# Altium integrated library STM32F466_EVAL_BOARD.IntLib: 93 symbols
Pins are listed as number, name and electrical type; pins without a type are passive.

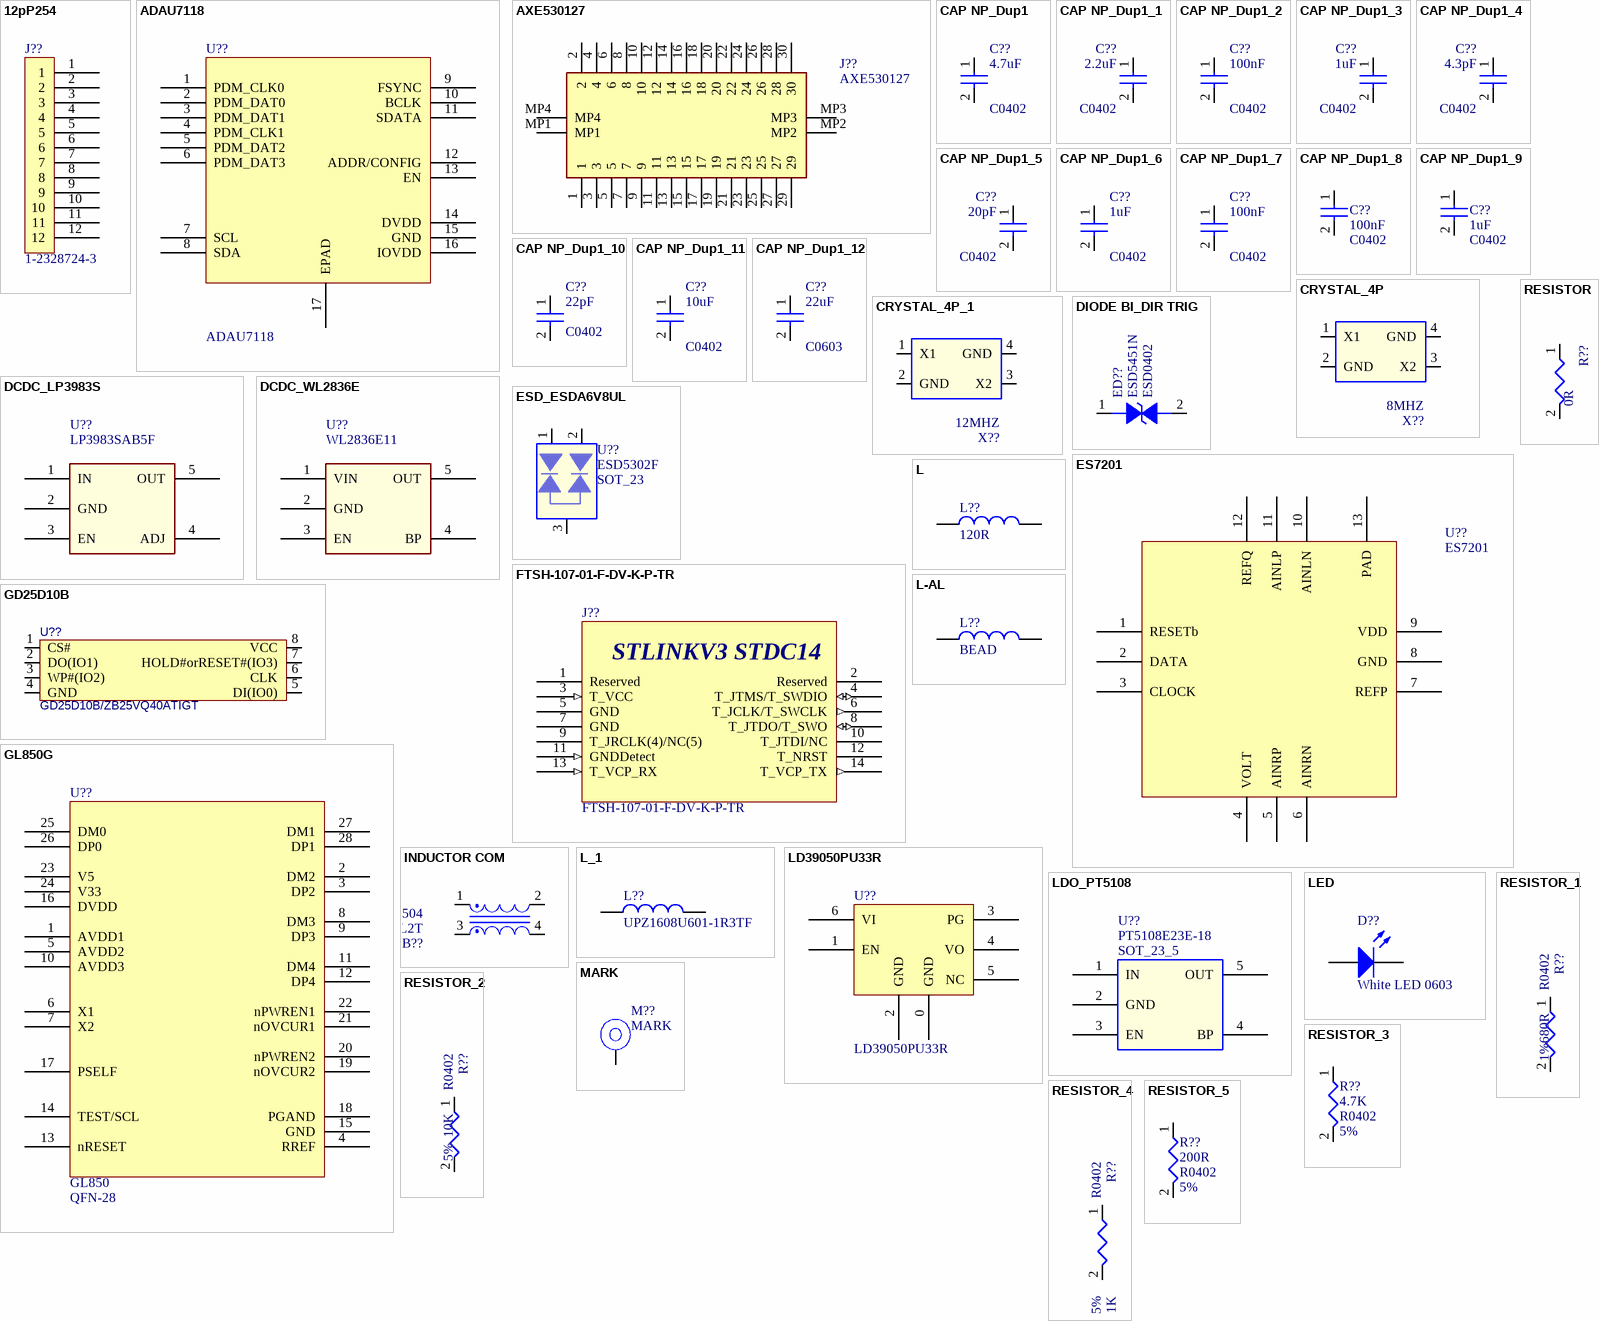
[diagram p0: symbols 12pP254 to RESISTOR_5]

## 12pP254
designator J??, comment 1-2328724-3
FFC & FPC连接器 13 PIN FPC CONNECTOR 0.3mmP FRONT FLIP
footprint 123287243
pins: 1, 2, 3, 4, 5, 6, 7, 8, 9, 10, 11, 12

## ADAU7118
designator U??
16-lead, 3 mm × 3 mm, 0.50 mm pitch LFCSP
footprint QFN50P300X300X80-17N
pins: 1 PDM_CLK0, 2 PDM_DAT0, 3 PDM_DAT1, 4 PDM_CLK1, 5 PDM_DAT2, 6 PDM_DAT3, 7 SCL, 8 SDA, 9 FSYNC, 10 BCLK, 11 SDATA, 12 ADDR/CONFIG, 13 EN, 14 DVDD, 15 GND, 16 IOVDD, 17 EPAD

## AXE530127
designator J??
AXE530127 Connector; Manufacturer_Name: Panasonic; Datasheet Link: https://componentsearchengine.com//AXE530127.pdf; Height: 0.97mm; Mouser2 Part Number: 679-AXE530127; Mouser2 Price/Stock: https://www.mouser.com/Search/Refine.aspx?Keyword=679-AXE530127; Manufacturer_Part_Number: AXE530127
footprint AXE530127_counterclock_pin
pins: 1, 2, 3, 4, 5, 6, 7, 8, 9, 10, 11, 12, 13, 14, 15, 16, 17, 18, 19, 20, 21, 22, 23, 24, 25, 26, 27, 28, 29, 30, MP1, MP2, MP3, MP4

## CAP NP_Dup1
designator C??, comment 4.7uF  PCB Footprint: C0402
cap,4.70uF,+/-10%,6.3V,X5R,C0402; Priority: A; Part Type: C0402
footprint C0402_L (无极性贴片电容)
pins: 1, 2

## CAP NP_Dup1_1
designator C??, comment 2.2uF  PCB Footprint: C0402
cap,2.20uF,+/-10%,10V,X5R,C0402; Priority: A; Part Type: C0402
footprint C0402_L (无极性贴片电容)
pins: 1, 2

## CAP NP_Dup1_2
designator C??, comment 100nF  PCB Footprint: C0402
cap,100.00nF,+/-10%,10V,X5R,C0402; Priority: A; Part Type: C0402
footprint C0402_L (无极性贴片电容)
pins: 1, 2

## CAP NP_Dup1_3
designator C??, comment 1uF  PCB Footprint: C0402
cap,1.00uF,+/-10%,10V,X5R,C0402; Priority: A; Part Type: C0402
footprint C0402_L (无极性贴片电容)
pins: 1, 2

## CAP NP_Dup1_4
designator C??, comment 4.3pF  PCB Footprint: C0402
cap,4.3pF,+/-10%,25V,X5R,C0402; Priority: A; Part Type: C0402
footprint C0402_L (无极性贴片电容)
pins: 1, 2

## CAP NP_Dup1_5
designator C??, comment 20pF  PCB Footprint: C0402
cap,20pF,+/-10%,25V,X5R,C0402; Priority: A; Part Type: C0402
footprint C0402_L (无极性贴片电容)
pins: 1, 2

## CAP NP_Dup1_6
designator C??, comment 1uF  PCB Footprint: C0402
cap,1.00uF,+/-10%,6.3V,X5R,C0402; Priority: A; Part Type: C0402
footprint C0402_L (无极性贴片电容)
pins: 1, 2

## CAP NP_Dup1_7
designator C??, comment 100nF  PCB Footprint: C0402
cap,1.0uF,+/-10%,6.3V,C0402; Priority: A; Part Type: C0402
footprint C0402_L (无极性贴片电容)
pins: 1, 2

## CAP NP_Dup1_8
designator C??, comment 100nF  PCB Footprint: C0402
cap,100.00nF,+/-10%,25V,X5R,C0402; Priority: A; Part Type: C0402
footprint C0402_L (无极性贴片电容)
pins: 1, 2

## CAP NP_Dup1_9
designator C??, comment 1uF  PCB Footprint: C0402
cap,1.0uF,+/-10%,6.3V,X5R,C0402; Priority: A; Part Type: C0402
footprint C0402_L (无极性贴片电容)
pins: 1, 2

## CAP NP_Dup1_10
designator C??, comment 22pF  PCB Footprint: C0402
cap,22pF,+/-10%,6.3V,X5R,C0402; Priority: A; Part Type: C0402
footprint C0402_L (无极性贴片电容)
pins: 1, 2

## CAP NP_Dup1_11
designator C??, comment 10uF  PCB Footprint: C0402
cap,10uF,+/-10%,6.3V,X5R,C0402; Priority: A; Part Type: C0402
footprint C0402_L (无极性贴片电容)
pins: 1, 2

## CAP NP_Dup1_12
designator C??, comment 22uF  PCB Footprint: C0603
cap,22.00uF,+/-10%,10V,X5R,C0603; Priority: A; Part Type: C0603
footprint C0805
footprint C0805_L (拸憤俶泂萇)
footprint C0603_L (拸憤俶泂萇)
pins: 1, 2

## CRYSTAL_4P
designator X??, comment 8MHZ
8MHZ (16pF), 3.2 mm x 2.5 mm / 无源晶振(谐振器）
footprint XTAL_3225-8MHZ
pins: 1 X1, 2 GND (power), 3 X2, 4 GND (power)

## CRYSTAL_4P_1
designator X??, comment 12MHZ
12MHZ (16pF), 3.2 mm x 2.5 mm / 无源晶振(谐振器）
footprint XTAL_3225-8MHZ
pins: 1 X1, 2 GND (power), 3 X2, 4 GND (power)

## DCDC_LP3983S
designator U??, comment LP3983SAB5F
LP3983SAB5F 2V9 DCfor CMOS SensorSOT_23_5
footprint SOT_23_5
footprint SOT23-5 (SOT23, 5-Leads, Body 2.9x1.6mm, Pitch 0.95mm, IPC Medium Density)
pins: 1 IN, 2 GND, 3 EN, 4 ADJ, 5 OUT

## DCDC_WL2836E
designator U??, comment WL2836E11
WL2836E11 DCDC for CMOS Sensor
footprint SOT23-5 (SOT23, 5-Leads, Body 2.9x1.6mm, Pitch 0.95mm, IPC Medium Density)
pins: 1 VIN, 2 GND, 3 EN, 4 BP, 5 OUT

## DIODE BI_DIR TRIG
designator ED??, comment ESD5451N  PCB Footprint: ESD0402
1-Line, Bi-directional, Transient Voltage Suppressors.17.5pF.; Priority: A; Part Type: ESD_TVS
footprint ESD0402
pins: 1, 2

## ES7201
designator U??
ES7201 PCM to PDM Convertor
footprint QFN12
pins: 1 RESETb, 2 DATA, 3 CLOCK, 4 VOLT, 5 AINRP, 6 AINRN, 7 REFP, 8 GND, 9 VDD, 10 AINLN, 11 AINLP, 12 REFQ, 13 PAD

## ESD_ESDA6V8UL
designator U??, comment ESD5302F  PCB Footprint: SOT_23
2-Lines, Uni-directional,Ultra-low Capacitance.Transient Voltage Suppressors; Priority: A; Part Type: ESD_TVS
footprint SOT23 (SOT23, 3-Leads, Body 2.9x1.3mm, Pitch 0.95mm, Lead Span 2.4mm, IPC Medium Density)
pins: 1, 2, 3

## FTSH-107-01-F-DV-K-P-TR
designator J??
Samtec 14Pin 2x7 Header Connector. / STM32_STLINK_V3 Debug
footprint SAMTEC-FTSH-107-01-X-DV
pins: 1 Reserved, 2 Reserved, 3 T_VCC (in), 4 T_JTMS/T_SWDIO (io), 5 GND, 6 T_JCLK/T_SWCLK (out), 7 GND, 8  T_JTDO/T_SWO (io), 9 T_JRCLK(4)/NC(5), 10 T_JTDI/NC, 11 GNDDetect (in), 12 T_NRST, 13 T_VCP_RX (in), 14 T_VCP_TX (out)
text: STLINKV3 STDC14

## GD25D10B
designator U??, comment GD25D10B/ZB25VQ40ATIGT
SPI FLASH SOP-8
footprint SOIC-8W
footprint SOIC-8 (封装库来自淘宝卖家 ID：黄晶宝石)
footprint SOP8_5R00X4R00X1R75
footprint SOIC-8 (封装库来自淘宝卖家 ID：黄晶宝石)
pins: 1 CS#, 2 DO(IO1), 3 WP#(IO2), 4 GND, 5 DI(IO0), 6 CLK, 7 HOLD#orRESET#(IO3), 8 VCC

## GL850G
designator U??, comment GL850  Package: QFN-28
GL850 4 Port USB HUB QFN-28
footprint QFN-28
pins: 1 AVDD1, 2 DM2, 3 DP2, 4 RREF, 5 AVDD2, 6 X1, 7 X2, 8 DM3, 9 DP3, 10 AVDD3, 11 DM4, 12 DP4, 13 nRESET, 14 TEST/SCL, 15 GND, 16 DVDD, 17 PSELF, 18 PGAND, 19 nOVCUR2, 20 nPWREN2, 21 nOVCUR1, 22 nPWREN1, 23 V5, 24 V33, 25 DM0, 26 DP0, 27 DM1, 28 DP1

## INDUCTOR COM
designator FB??, comment MCZ1210AH900L2T  PCB Footprint: RP2_0504  (net tie, no BOM)
MCZ1210AH900L2T, 0603 90Ohm 100MHz; Priority: A; Part Type: BEAD
footprint L0402D
footprint RP2_0504
pins: 1, 2, 3, 4

## L
designator L??, comment 120R
鐵氧體磁珠 120 OHM 25%
footprint L0402 (小功率贴片电感)
pins: 1, 2

## L-AL
designator L??, comment BEAD
鐵氧體磁珠 33ohm 0.55A 550mOhms 0402 Chip Bead
footprint L0402 (小功率贴片电感)
pins: 1, 2

## L_1
designator L??, comment UPZ1608U601-1R3TF
UPZ1608U601-1R3TF 0603 贴片小功率电感
footprint L0402 (小功率贴片电感)
footprint L0603
pins: 1, 2

## LD39050PU33R
designator U??
LD39050PU33R / 6-DFN (3x3) / Output 500mA
footprint SON95P300X300X100-7N
pins: 0 GND, 1 EN, 2 GND, 3 PG, 4 VO, 5 NC, 6 VI

## LDO_PT5108
designator U??, comment PT5108E23E-18  PCB Footprint: SOT_23_5
High-PSRR 600mA LDO.Output1.8V.; Priority: A; Part Type: LDO
footprint SOT23-5 (SOT23, 5-Leads, Body 2.9x1.6mm, Pitch 0.95mm, IPC Medium Density)
pins: 1 IN, 2 GND, 3 EN, 4 BP, 5 OUT

## LED
designator D??, comment White LED 0603
LED 0603 Wite 发光二极管; Part Type: SS14
footprint LED0603_W (白色0603LED)
pins: 1 A, 2 K

## MARK
designator M??  (net tie, no BOM)
PCBA MARKS
footprint MARK
pins: 1

## RESISTOR
designator R??, comment 0R
通用厚膜电阻,0R,+/-5%,R0402; Tolerance: 5%; Priority: A; PCB Footprint: R0402; Part Type: 通用厚膜电阻
footprint R0402 (Footprint not found)
pins: 1, 2

## RESISTOR_1
designator R??, comment 680R  PCB Footprint: R0402  Tolerance: 1%
通用厚膜电阻,680R,+/-1%,R0402; Priority: A; Part Type: 通用厚膜电阻
footprint R0402 (Footprint not found)
pins: 1, 2

## RESISTOR_2
designator R??, comment 10K  PCB Footprint: R0402  Tolerance: 5%
通用厚膜电阻,10K,+/-5%,R0402; Priority: A; Part Type: 通用厚膜电阻
footprint R0402 (Footprint not found)
pins: 1, 2

## RESISTOR_3
designator R??, comment 4.7K  PCB Footprint: R0402  Tolerance: 5%
通用厚膜电阻,4.7K,+/-5%,R0402; Priority: A; Part Type: 通用厚膜电阻
footprint R0402 (Footprint not found)
pins: 1, 2

## RESISTOR_4
designator R??, comment 1K  PCB Footprint: R0402  Tolerance: 5%
通用厚膜电阻,1K,+/-5%,R0405; Priority: A; Part Type: 通用厚膜电阻
footprint R0402 (Footprint not found)
pins: 1, 2

## RESISTOR_5
designator R??, comment 200R  PCB Footprint: R0402  Tolerance: 5%
通用厚膜电阻,200R,+/-5%,R0402; Priority: A; Part Type: 通用厚膜电阻
footprint R0402 (Footprint not found)
pins: 1, 2

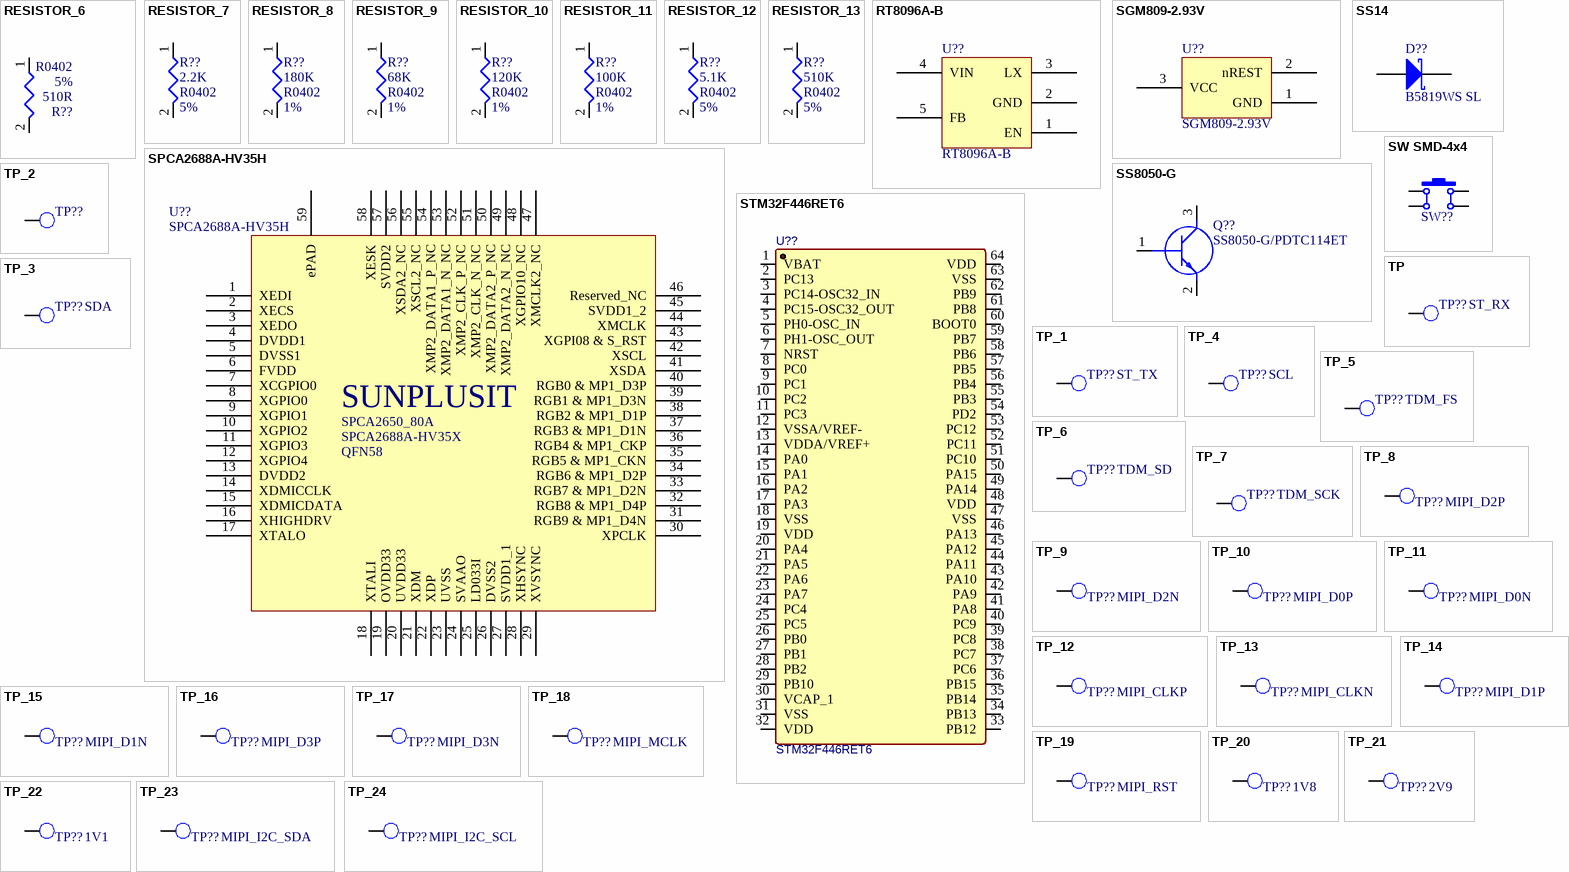
[diagram p1: symbols RESISTOR_6 to TP_24]

## RESISTOR_6
designator R??, comment 510R  PCB Footprint: R0402  Tolerance: 5%
通用厚膜电阻,510R,+/-5%,R0402; Priority: A; Part Type: 通用厚膜电阻
footprint R0402 (Footprint not found)
pins: 1, 2

## RESISTOR_7
designator R??, comment 2.2K  PCB Footprint: R0402  Tolerance: 5%
通用厚膜电阻,2.2K,+/-5%,R0402; Priority: A; Part Type: 通用厚膜电阻
footprint R0402 (Footprint not found)
pins: 1, 2

## RESISTOR_8
designator R??, comment 180K  PCB Footprint: R0402  Tolerance: 1%
通用厚膜电阻,180K,+/-1%,R0402,1/16W.; Priority: A; Part Type: 通用厚膜电阻
footprint R0402 (Footprint not found)
pins: 1, 2

## RESISTOR_9
designator R??, comment 68K  PCB Footprint: R0402  Tolerance: 1%
通用厚膜电阻,68K,+/-1%,R0402; Priority: A; Part Type: 通用厚膜电阻
footprint R0402 (Footprint not found)
pins: 1, 2

## RESISTOR_10
designator R??, comment 120K  PCB Footprint: R0402  Tolerance: 1%
通用厚膜电阻,180K,+/-1%,R0402,1/16W.; Priority: A; Part Type: 通用厚膜电阻
footprint R0402 (Footprint not found)
pins: 1, 2

## RESISTOR_11
designator R??, comment 100K  PCB Footprint: R0402  Tolerance: 1%
通用厚膜电阻,100K,+/-1%,R0402; Priority: A; Part Type: 通用厚膜电阻
footprint R0402 (Footprint not found)
pins: 1, 2

## RESISTOR_12
designator R??, comment 5.1K  PCB Footprint: R0402  Tolerance: 5%
通用厚膜电阻,5.1K,+/-5%,R0402; Priority: A; Part Type: 通用厚膜电阻
footprint R0402 (Footprint not found)
pins: 1, 2

## RESISTOR_13
designator R??, comment 510K  PCB Footprint: R0402  Tolerance: 5%
通用厚膜电阻,510K,+/-1%,R0402; Priority: A; Part Type: 通用厚膜电阻
footprint R0402 (Footprint not found)
pins: 1, 2

## RT8096A-B
designator U??
RT8096A-B / SOT-23-5
footprint SOT_23_5
pins: 1 EN, 2 GND, 3 LX, 4 VIN, 5 FB

## SGM809-2.93V
designator U??  (net tie, no BOM)
SGM809-2.93V SOT-23-3/SOT-23 / Microprocessor Supervisory Circuit / Power on Reset
footprint SOT23 (SOT23, 3-Leads, Body 2.9x1.3mm, Pitch 0.95mm, Lead Span 2.4mm, IPC Medium Density)
pins: 1 GND, 2 nREST, 3 VCC

## SPCA2688A-HV35H
designator U??
SPCA2688A-HV35H ISP IC / QFN58 0.4MM
footprint SPCA2680A_QFN58
pins: 1 XEDI, 2 XECS, 3 XEDO, 4 DVDD1, 5 DVSS1, 6 FVDD, 7 XCGPIO0, 8 XGPIO0, 9 XGPIO1, 10 XGPIO2, 11 XGPIO3, 12 XGPIO4, 13 DVDD2, 14 XDMICCLK, 15 XDMICDATA, 16 XHIGHDRV, 17 XTALO, 18 XTALI, 19 OVDD33, 20 UVDD33, 21 XDM, 22 XDP, 23 UVSS, 24 SVAAO, 25 LD033I, 26 DVSS2, 27 SVDD1_1, 28 XHSYNC, 29 XVSYNC, 30 XPCLK, 31 RGB9 & MP1_D4N, 32 RGB8 & MP1_D4P, 33 RGB7 & MP1_D2N, 34 RGB6 & MP1_D2P, 35 RGB5 & MP1_CKN, 36 RGB4 & MP1_CKP, 37 RGB3 & MP1_D1N, 38 RGB2 & MP1_D1P, 39 RGB1 & MP1_D3N, 40 RGB0 & MP1_D3P, 41 XSDA, 42 XSCL, 43 XGPI08 & S_RST, 44 XMCLK, 45 SVDD1_2, 46 Reserved_NC, 47 XMCLK2_NC, 48 XGPIO10_NC, 49 XMP2_DATA2_N_NC, 50 XMP2_DATA2_P_NC, 51 XMP2_CLK_N_NC, 52 XMP2_CLK_P_NC, 53 XMP2_DATA1_N_NC, 54 XMP2_DATA1_P_NC, 55 XSCL2_NC, 56 XSDA2_NC, 57 SVDD2, 58 XESK, 59 ePAD
text: SUNPLUSIT; SPCA2650_80A; SPCA2688A-HV35X; QFN58

## SS14
designator D??, comment B5819WS SL
B5819WS SL 肖特基二极管 / SOD-323; Part Type: SS14
footprint SOD-323 (1.8x1.3X0.9mm（长宽高，不包括引脚）)
pins: 1 A, 2 K

## SS8050-G
designator Q??, comment SS8050-G/PDTC114ET
Transistor BJT NPN; Manufacturer_Name: Comchip Technology; Datasheet Link: https://componentsearchengine.com//SS8050-G.pdf; Height: 1.15mm; Mouser2 Part Number: 750-SS8050-G; Mouser2 Price/Stock: https://www.mouser.com/Search/Refine.aspx?Keyword=750-SS8050-G; Manufacturer_Part_Number: SS8050-G
footprint SOT23-3N (SOT23, 3-Leads, Body 2.9x1.3mm, Pitch 0.95mm, Lead Span 2.4mm, IPC Medium Density)
footprint SOT23 (SOT23, 3-Leads, Body 2.9x1.3mm, Pitch 0.95mm, Lead Span 2.4mm, IPC Medium Density)
pins: 1 B, 2 E, 3 C

## STM32F446RET6
designator U??
footprint LQFP64_L (封装库来自淘宝 ID：黄晶宝石 Thin QFP, 64-Leads, Body 10x10mm, Pitch 0.5mm, IPC High Density)
pins: 1 VBAT, 2 PC13, 3 PC14-OSC32_IN, 4 PC15-OSC32_OUT, 5 PH0-OSC_IN, 6 PH1-OSC_OUT, 7 NRST, 8 PC0, 9 PC1, 10 PC2, 11 PC3, 12 VSSA/VREF-, 13 VDDA/VREF+, 14 PA0, 15 PA1, 16 PA2, 17 PA3, 18 VSS, 19 VDD, 20 PA4, 21 PA5, 22 PA6, 23 PA7, 24 PC4, 25 PC5, 26 PB0, 27 PB1, 28 PB2, 29 PB10, 30 VCAP_1, 31 VSS, 32 VDD, 33 PB12, 34 PB13, 35 PB14, 36 PB15, 37 PC6, 38 PC7, 39 PC8, 40 PC9, 41 PA8, 42 PA9, 43 PA10, 44 PA11, 45 PA12, 46 PA13, 47 VSS, 48 VDD, 49 PA14, 50 PA15, 51 PC10, 52 PC11, 53 PC12, 54 PD2, 55 PB3, 56 PB4, 57 PB5, 58 PB6, 59 PB7, 60 BOOT0, 61 PB8, 62 PB9, 63 VSS, 64 VDD

## SW SMD-4x4
designator SW??, comment 4x4x1.5  (value not drawn)
贴片4x4轻触开关
footprint SW SMD-4*4*1.5 (轻触开关，长宽高：4*4*1.5mm)
footprint TSW SMD-6*6*4.3 (6*6*4.3mm)
footprint TSW SMD-6*6*5 (6*6*5mm           淘宝ID:黄晶宝石)
pins: 1, 2, 3, 4

## TP
designator TP??, comment ST_RX  (no BOM)
Test Point 0.7mm; PCB Footprint: TP_0R50; Priority: A; Part Type: TP
footprint TP_0R50
footprint TP_0R70
pins: 1

## TP_1
designator TP??, comment ST_TX  (no BOM)
Test Point 0.7mm; PCB Footprint: TP_0R50; Priority: A; Part Type: TP
footprint TP_0R50
footprint TP_0R70
pins: 1

## TP_2
designator TP??  (no BOM)
Test Point 0.7mm; PCB Footprint: TP_0R50; Priority: A; Part Type: TP
footprint TP_0R50
footprint TP_0R70
pins: 1

## TP_3
designator TP??, comment SDA  (no BOM)
Test Point 0.7mm; PCB Footprint: TP_0R50; Priority: A; Part Type: TP
footprint TP_0R50
footprint TP_0R70
pins: 1

## TP_4
designator TP??, comment SCL  (no BOM)
Test Point 0.7mm; PCB Footprint: TP_0R50; Priority: A; Part Type: TP
footprint TP_0R50
footprint TP_0R70
pins: 1

## TP_5
designator TP??, comment TDM_FS  (no BOM)
Test Point 0.7mm; PCB Footprint: TP_0R50; Priority: A; Part Type: TP
footprint TP_0R50
footprint TP_0R70
pins: 1

## TP_6
designator TP??, comment TDM_SD  (no BOM)
Test Point 0.7mm; PCB Footprint: TP_0R50; Priority: A; Part Type: TP
footprint TP_0R50
footprint TP_0R70
pins: 1

## TP_7
designator TP??, comment TDM_SCK  (no BOM)
Test Point 0.7mm; PCB Footprint: TP_0R50; Priority: A; Part Type: TP
footprint TP_0R50
footprint TP_0R70
pins: 1

## TP_8
designator TP??, comment MIPI_D2P  (no BOM)
Test Point 0.7mm; PCB Footprint: TP_0R50; Priority: A; Part Type: TP
footprint TP_0R50
footprint TP_0R70
pins: 1

## TP_9
designator TP??, comment MIPI_D2N  (no BOM)
Test Point 0.7mm; PCB Footprint: TP_0R50; Priority: A; Part Type: TP
footprint TP_0R50
footprint TP_0R70
pins: 1

## TP_10
designator TP??, comment MIPI_D0P  (no BOM)
Test Point 0.7mm; PCB Footprint: TP_0R50; Priority: A; Part Type: TP
footprint TP_0R50
footprint TP_0R70
pins: 1

## TP_11
designator TP??, comment MIPI_D0N  (no BOM)
Test Point 0.7mm; PCB Footprint: TP_0R50; Priority: A; Part Type: TP
footprint TP_0R50
footprint TP_0R70
pins: 1

## TP_12
designator TP??, comment MIPI_CLKP  (no BOM)
Test Point 0.7mm; PCB Footprint: TP_0R50; Priority: A; Part Type: TP
footprint TP_0R50
footprint TP_0R70
pins: 1

## TP_13
designator TP??, comment MIPI_CLKN  (no BOM)
Test Point 0.7mm; PCB Footprint: TP_0R50; Priority: A; Part Type: TP
footprint TP_0R50
footprint TP_0R70
pins: 1

## TP_14
designator TP??, comment MIPI_D1P  (no BOM)
Test Point 0.7mm; PCB Footprint: TP_0R50; Priority: A; Part Type: TP
footprint TP_0R50
footprint TP_0R70
pins: 1

## TP_15
designator TP??, comment MIPI_D1N  (no BOM)
Test Point 0.7mm; PCB Footprint: TP_0R50; Priority: A; Part Type: TP
footprint TP_0R50
footprint TP_0R70
pins: 1

## TP_16
designator TP??, comment MIPI_D3P  (no BOM)
Test Point 0.7mm; PCB Footprint: TP_0R50; Priority: A; Part Type: TP
footprint TP_0R50
footprint TP_0R70
pins: 1

## TP_17
designator TP??, comment MIPI_D3N  (no BOM)
Test Point 0.7mm; PCB Footprint: TP_0R50; Priority: A; Part Type: TP
footprint TP_0R50
footprint TP_0R70
pins: 1

## TP_18
designator TP??, comment MIPI_MCLK  (no BOM)
Test Point 0.7mm; PCB Footprint: TP_0R50; Priority: A; Part Type: TP
footprint TP_0R50
footprint TP_0R70
pins: 1

## TP_19
designator TP??, comment MIPI_RST  (no BOM)
Test Point 0.7mm; PCB Footprint: TP_0R50; Priority: A; Part Type: TP
footprint TP_0R50
footprint TP_0R70
pins: 1

## TP_20
designator TP??, comment 1V8  (no BOM)
Test Point 0.7mm; PCB Footprint: TP_0R50; Priority: A; Part Type: TP
footprint TP_0R50
footprint TP_0R70
pins: 1

## TP_21
designator TP??, comment 2V9  (no BOM)
Test Point 0.7mm; PCB Footprint: TP_0R50; Priority: A; Part Type: TP
footprint TP_0R50
footprint TP_0R70
pins: 1

## TP_22
designator TP??, comment 1V1  (no BOM)
Test Point 0.7mm; PCB Footprint: TP_0R50; Priority: A; Part Type: TP
footprint TP_0R50
footprint TP_0R70
pins: 1

## TP_23
designator TP??, comment MIPI_I2C_SDA  (no BOM)
Test Point 0.7mm; PCB Footprint: TP_0R50; Priority: A; Part Type: TP
footprint TP_0R50
footprint TP_0R70
pins: 1

## TP_24
designator TP??, comment MIPI_I2C_SCL  (no BOM)
Test Point 0.7mm; PCB Footprint: TP_0R50; Priority: A; Part Type: TP
footprint TP_0R50
footprint TP_0R70
pins: 1

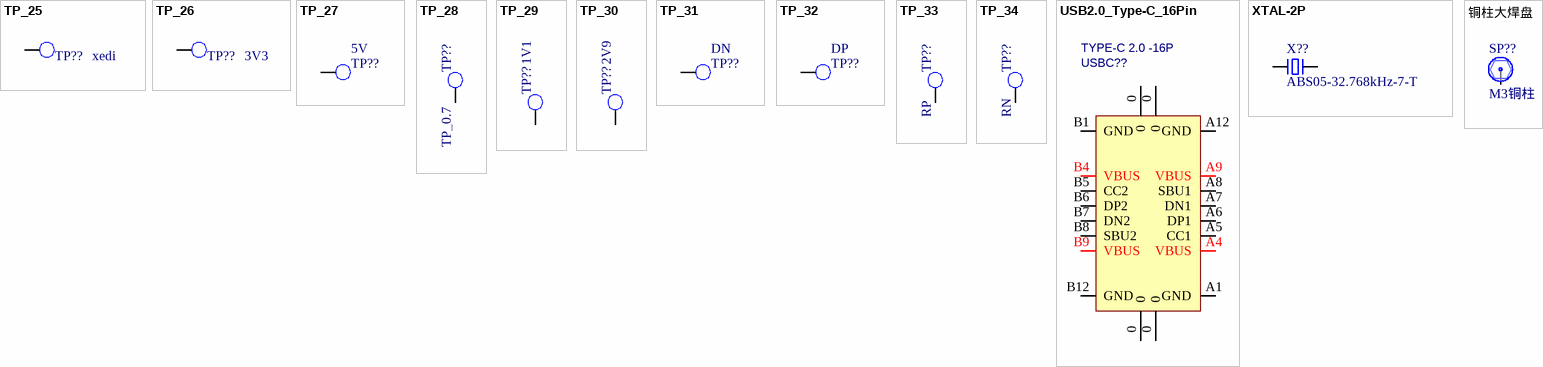
[diagram p2: symbols TP_25 to 铜柱大焊盘]

## TP_25
designator TP??, comment xedi  (no BOM)
Test Point 0.7mm; PCB Footprint: TP_0R50; Priority: A; Part Type: TP
footprint TP_0R50
footprint TP_0R70
pins: 1

## TP_26
designator TP??, comment 3V3  (no BOM)
Test Point 0.7mm; PCB Footprint: TP_0R50; Priority: A; Part Type: TP
footprint TP_0R50
footprint TP_0R70
pins: 1

## TP_27
designator TP??, comment 5V  (no BOM)
Test Point 0.7mm; PCB Footprint: TP_0R50; Priority: A; Part Type: TP
footprint TP_0R50
footprint TP_0R70
pins: 1

## TP_28
designator TP??, comment TP_0.7  (net tie, no BOM)
Test Point 0.7mm; PCB Footprint: TP_0R50; Priority: A; Part Type: TP
footprint TP_0R50
footprint TP_0R70
pins: 1

## TP_29
designator TP??, comment 1V1  (no BOM)
Test Point 0.7mm; PCB Footprint: TP_0R50; Priority: A; Part Type: TP
footprint TP_0R50
footprint TP_0R70
pins: 1

## TP_30
designator TP??, comment 2V9  (no BOM)
Test Point 0.7mm; PCB Footprint: TP_0R50; Priority: A; Part Type: TP
footprint TP_0R50
footprint TP_0R70
pins: 1

## TP_31
designator TP??, comment DN  (no BOM)
Test Point 0.7mm; PCB Footprint: TP_0R50; Priority: A; Part Type: TP
footprint TP_0R50
footprint TP_0R70
pins: 1

## TP_32
designator TP??, comment DP  (no BOM)
Test Point 0.7mm; PCB Footprint: TP_0R50; Priority: A; Part Type: TP
footprint TP_0R50
footprint TP_0R70
pins: 1

## TP_33
designator TP??, comment RP  (no BOM)
Test Point 0.7mm; PCB Footprint: TP_0R50; Priority: A; Part Type: TP
footprint TP_0R50
footprint TP_0R70
pins: 1

## TP_34
designator TP??, comment RN  (no BOM)
Test Point 0.7mm; PCB Footprint: TP_0R50; Priority: A; Part Type: TP
footprint TP_0R50
footprint TP_0R70
pins: 1

## USB2.0_Type-C_16Pin
designator USBC??, comment TYPE-C 2.0 -16P
USB2.0_Type-C_16Pin母座
footprint USB-C-SMD_16P (封装库来自淘宝ID:黄晶宝石)
pins: 0, 0, 0, 0, A1 GND, A4 VBUS, A5 CC1, A6 DP1, A7 DN1, A8 SBU1, A9 VBUS, A12 GND, B1 GND, B4 VBUS, B5 CC2, B6 DP2, B7 DN2, B8 SBU2, B9 VBUS, B12 GND

## XTAL-2P
designator X??, comment ABS05-32.768kHz-7-T
ABS05-32.768kHz-7-T / 3215 2脚无源晶振(谐振器）
footprint XTAL_3215-32.768K
pins: 1, 2

## 铜柱大焊盘
designator SP??, comment M3铜柱  (net tie, no BOM)
铜柱
footprint M3x4_N (M3铜柱，长：4mm)
footprint M3x5_N (M3铜柱，长：5mm)
footprint M3x6_N (M3铜柱，长：6mm)
footprint M3x7_N (M3铜柱，长：7mm)
footprint M3x8_N (M3铜柱，长：8mm)
footprint M3x9_N (M3铜柱，长：9mm)
footprint M3x10_N (M3铜柱，长：10mm)
footprint M3x11_N (M3铜柱，长：11mm)
footprint M3x12_N (M3铜柱，长：12mm)
footprint M3x13_N (M3铜柱，长：13mm)
footprint M3x14_N (M3铜柱，长：14mm)
footprint M3x15_N (M3铜柱，长：15mm)
footprint M3x16_N (M3铜柱，长：16mm)
footprint M3x17_N (M3铜柱，长：17mm)
footprint M3x18_N (M3铜柱，长：18mm)
footprint M3x20_N (M3铜柱，长：20mm)
footprint M3x21_N (M3铜柱，长：21mm)
footprint M3x22_N (M3铜柱，长：22mm)
footprint M3x23_N (M3铜柱，长：23mm)
footprint M3x24_N (M3铜柱，长：24mm)
footprint M3x25_N (M3铜柱，长：25mm)
footprint M3x26_N (M3铜柱，长：26mm)
footprint M3x27_N (M3铜柱，长：27mm)
footprint M3x28_N (M3铜柱，长：28mm)
footprint M3x30_N (M3铜柱，长：30mm)
footprint M3x32_N (M3铜柱，长：32mm)
footprint M3x35_N (M3铜柱，长：35mm)
footprint M3x40_N (M3铜柱，长：40mm)
footprint M3x45_N (M3铜柱，长：45mm)
footprint M3x50_N (M3铜柱，长：50mm)
footprint M3x55_N (M3铜柱，长：55mm)
footprint M3x60_N (M3铜柱，长：60mm)
footprint M3x65_N (M3铜柱，长：65mm)
pins: 1